# Altium footprint library HW_HOLLAND_NCDM_MONITOR_R1.PcbLib: 472 footprints (part 9 of 30)
Each footprint in its own frame and in the unit in brackets; x right, y up, seen from the top. Pads: shape width x height; smd on the part's side, far side on the other; paste and mask are expansions set on the pad; w line width, h text height; cw(c..) or ccw(c..) is an arc to the next point about the centre after c.
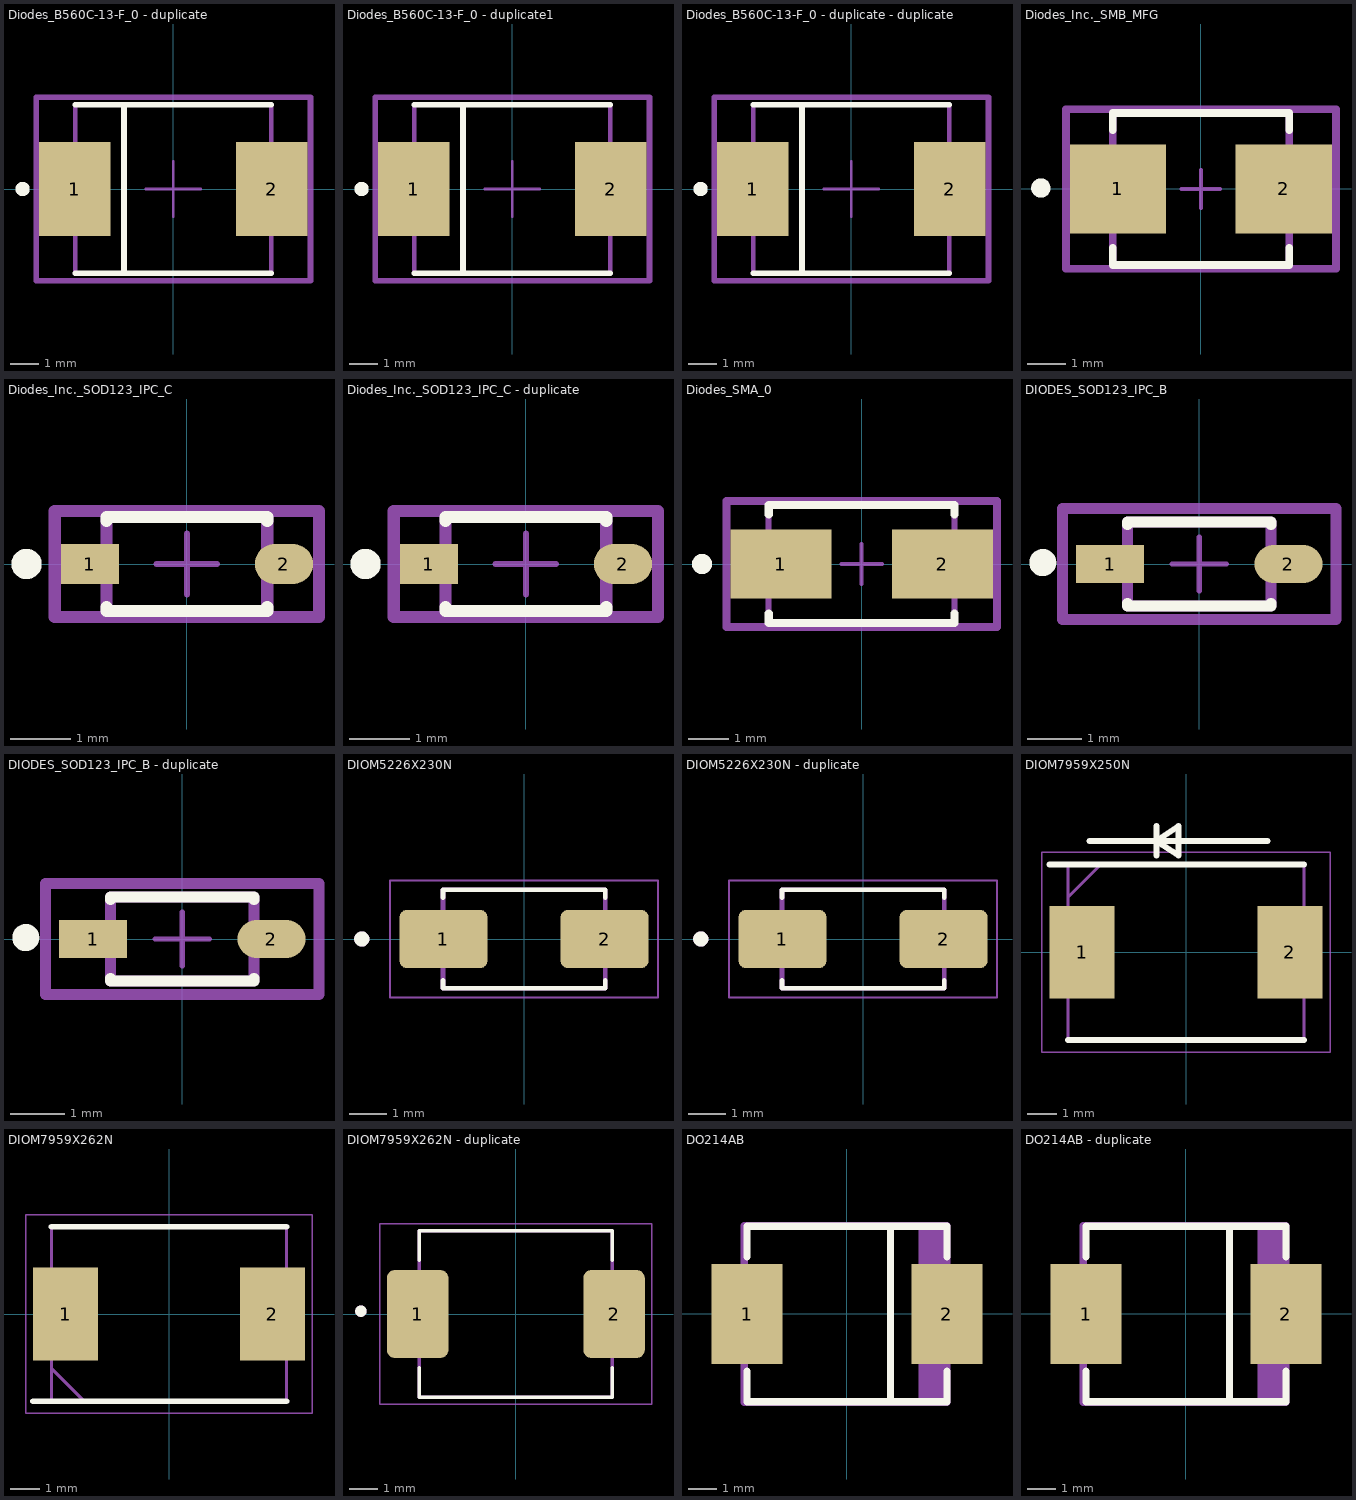
[diagram p8: the footprints below, top view; thin cyan lines are the x and y axes]

## Diodes_B560C-13-F_0 - duplicate [mm]
pads (2):
  rect 2.5x3.3 smd paste+0 mask+0: 1(-3.45,0) 2(3.45,0)
Top Overlay:
  circle w0.25: c-5.275,0 r0.125
  lines w0.2: -3.427,-2.953 3.427,-2.953 ; -3.427,2.953 3.427,2.953 ; -1.725,-2.852 -1.725,2.852
Top Courtyard:
  lines w0.2: -4.8,-3.21 4.8,-3.21 4.8,3.21 -4.8,3.21 -4.8,-3.21
  text ".Designator" at 0,0 h1
Mechanical 12:
  lines w0.15: -3.427,-2.953 3.427,-2.953 3.427,2.953 -3.427,2.953 -3.427,-2.953
Mechanical 15:
  lines w0.1: -0.963,0 0.963,0 ; 0,-0.963 0,0.963
  lines w0.2: -4.8,-3.21 4.8,-3.21 4.8,3.21 -4.8,3.21 -4.8,-3.21
3D body "Diode_Diodes_B560C-13-F_eec.STEP": height 0.25, standoff 0, extent -4.8,-3.21 4.8,3.21

## Diodes_B560C-13-F_0 - duplicate1 [mm]
pads (2):
  rect 2.5x3.3 smd paste+0 mask+0: 1(-3.45,0) 2(3.45,0)
Top Overlay:
  circle w0.25: c-5.275,0 r0.125
  lines w0.2: -3.427,-2.953 3.427,-2.953 ; -3.427,2.953 3.427,2.953 ; -1.725,-2.852 -1.725,2.852
Top Courtyard:
  lines w0.2: -4.8,-3.21 -4.8,3.21 4.8,3.21 4.8,-3.21 -4.8,-3.21
  text ".Designator" at 0,0 h1
Mechanical 12:
  lines w0.15: -3.427,-2.953 -3.427,2.953 3.427,2.953 3.427,-2.953 -3.427,-2.953
Mechanical 15:
  lines w0.1: -0.963,0 0.963,0 ; 0,-0.963 0,0.963
  lines w0.2: -4.8,-3.21 -4.8,3.21 4.8,3.21 4.8,-3.21 -4.8,-3.21
3D body "User Library-DO-214AB(SMC).STEP": height 2.67, standoff 0.03, extent -4.064,-3.15 4.064,3.15

## Diodes_B560C-13-F_0 - duplicate - duplicate [mm]
pads (2):
  rect 2.5x3.3 smd paste+0 mask+0: 1(-3.45,0) 2(3.45,0)
Top Overlay:
  circle w0.25: c-5.275,0 r0.125
  lines w0.2: -3.427,-2.953 3.427,-2.953 ; -3.427,2.953 3.427,2.953 ; -1.725,-2.852 -1.725,2.852
Top Courtyard:
  lines w0.2: -4.8,-3.21 4.8,-3.21 4.8,3.21 -4.8,3.21 -4.8,-3.21
  text ".Designator" at 0,0 h1
Mechanical 12:
  lines w0.15: -3.427,-2.953 3.427,-2.953 3.427,2.953 -3.427,2.953 -3.427,-2.953
Mechanical 15:
  lines w0.1: -0.963,0 0.963,0 ; 0,-0.963 0,0.963
  lines w0.2: -4.8,-3.21 4.8,-3.21 4.8,3.21 -4.8,3.21 -4.8,-3.21
3D body "Diode_Diodes_B560C-13-F_eec.STEP": height 0.25, standoff 0, extent -4.8,-3.21 4.8,3.21

## Diodes_Inc._SMB_MFG [mm]
pads (2):
  rect 2.5x2.3 smd paste+0 mask+0: 1(-2.15,0) 2(2.15,0)
Top Overlay:
  circle w0.25: c-4.15,0.025 r0.125
  lines w0.2: -2.285,-1.525 -2.285,-1.97 2.285,-1.97 2.285,-1.525 ; -2.285,1.525 -2.285,1.97 2.285,1.97 2.285,1.525
Top Courtyard:
  lines w0.2: -3.5,-2.07 3.5,-2.07 3.5,2.07 -3.5,2.07 -3.5,-2.07
  text ".Designator" at 0,0 h1.25
Mechanical 12:
  lines w0.2: -2.285,-1.97 2.285,-1.97 2.285,1.97 -2.285,1.97 -2.285,-1.97
Mechanical 15:
  lines w0.1: -0.5,0 0.5,0 ; 0,-0.5 0,0.5
  lines w0.2: -3.5,-2.07 3.5,-2.07 3.5,2.07 -3.5,2.07 -3.5,-2.07
3D body "Diode_Diodes_Inc._B240-13-F_eec.STEP": height 2.5, standoff 0, extent -2.648,-1.81 2.648,1.81

## Diodes_Inc._SOD123_IPC_C [mm]
pads (2):
  rect 0.957x0.662 smd paste+0 mask+0: 1(-1.6,0)
  rrect100% 0.957x0.662 smd paste+0 mask+0: 2(1.6,0)
Top Overlay:
  circle w0.25: c-2.645,0 r0.125
  lines w0.2: -1.325,-0.706 -1.325,-0.775 1.325,-0.775 1.325,-0.706 ; -1.325,0.706 -1.325,0.775 1.325,0.775 1.325,0.706
Top Courtyard:
  lines w0.2: -2.179,-0.875 -2.179,0.875 2.179,0.875 2.179,-0.875 -2.179,-0.875
  text ".Designator" at 0,0 h1
Mechanical 12:
  lines w0.2: -1.325,-0.775 -1.325,0.775 1.325,0.775 1.325,-0.775 -1.325,-0.775
Mechanical 15:
  lines w0.1: -0.5,0 0.5,0 ; 0,-0.5 0,0.5
  lines w0.2: -2.179,-0.875 -2.179,0.875 2.179,0.875 2.179,-0.875 -2.179,-0.875
3D body "Diode_Diodes_Inc._1N4148W-13-F_eec.STEP": height 0.25, standoff 0, extent -2.179,-0.875 2.179,0.875

## Diodes_Inc._SOD123_IPC_C - duplicate [mm]
pads (2):
  rect 0.957x0.662 smd paste+0 mask+0: 1(-1.6,0)
  rrect100% 0.957x0.662 smd paste+0 mask+0: 2(1.6,0)
Top Overlay:
  circle w0.25: c-2.645,0 r0.125
  lines w0.2: -1.325,-0.706 -1.325,-0.775 1.325,-0.775 1.325,-0.706 ; -1.325,0.706 -1.325,0.775 1.325,0.775 1.325,0.706
Top Courtyard:
  lines w0.2: -2.179,-0.875 -2.179,0.875 2.179,0.875 2.179,-0.875 -2.179,-0.875
  text ".Designator" at 0,0 h1
Mechanical 12:
  lines w0.2: -1.325,-0.775 -1.325,0.775 1.325,0.775 1.325,-0.775 -1.325,-0.775
Mechanical 15:
  lines w0.1: -0.5,0 0.5,0 ; 0,-0.5 0,0.5
  lines w0.2: -2.179,-0.875 -2.179,0.875 2.179,0.875 2.179,-0.875 -2.179,-0.875
3D body "Diode_Diodes_Inc._1N4148W-13-F_eec.STEP": height 0.25, standoff 0, extent -2.179,-0.875 2.179,0.875

## Diodes_SMA_0 [mm]
pads (2):
  rect 2.5x1.7 smd paste+0 mask+0: 1(-2,0) 2(2,0)
Top Overlay:
  circle w0.25: c-3.95,0 r0.125
  lines w0.2: -2.3,-1.225 -2.3,-1.46 2.3,-1.46 2.3,-1.225 ; -2.3,1.225 -2.3,1.46 2.3,1.46 2.3,1.225
Top Courtyard:
  lines w0.2: -3.35,-1.56 -3.35,1.56 3.35,1.56 3.35,-1.56 -3.35,-1.56
  text ".Designator" at 0,0 h1.25
Mechanical 12:
  lines w0.15: -2.3,-1.46 -2.3,1.46 2.3,1.46 2.3,-1.46 -2.3,-1.46
Mechanical 15:
  lines w0.1: -0.5,0 0.5,0 ; 0,-0.5 0,0.5
  lines w0.2: -3.35,-1.56 -3.35,1.56 3.35,1.56 3.35,-1.56 -3.35,-1.56
3D body "Diode_Diodes_B340LA-13-F_eec.STEP": height 2.5, standoff 0, extent -2.569,-1.296 2.561,1.309

## DIODES_SOD123_IPC_B [mm]
pads (2):
  rect 1.257x0.702 smd paste+0 mask+0: 1(-1.65,0)
  rrect100% 1.257x0.702 smd paste+0 mask+0: 2(1.65,0)
Top Overlay:
  circle w0.25: c-2.895,0.026 r0.125
  lines w0.2: -1.325,-0.726 -1.325,-0.775 1.325,-0.775 1.325,-0.726 ; -1.325,0.726 -1.325,0.775 1.325,0.775 1.325,0.726
Top Courtyard:
  lines w0.2: -2.529,-1.025 2.529,-1.025 2.529,1.025 -2.529,1.025 -2.529,-1.025
  text ".Designator" at 0,0.188 h1
Mechanical 12:
  lines w0.2: -1.325,-0.775 1.325,-0.775 1.325,0.775 -1.325,0.775 -1.325,-0.775
Mechanical 15:
  lines w0.1: -0.5,0 0.5,0 ; 0,-0.5 0,0.5
  lines w0.2: -2.529,-1.025 2.529,-1.025 2.529,1.025 -2.529,1.025 -2.529,-1.025
3D body "Diode_Diodes_1N5819HW-7-F_eec.STEP": height 1.45, standoff 0, extent -1.825,-0.775 1.825,0.775

## DIODES_SOD123_IPC_B - duplicate [mm]
pads (2):
  rect 1.257x0.702 smd paste+0 mask+0: 1(-1.65,0)
  rrect100% 1.257x0.702 smd paste+0 mask+0: 2(1.65,0)
Top Overlay:
  circle w0.25: c-2.895,0.026 r0.125
  lines w0.2: -1.325,-0.726 -1.325,-0.775 1.325,-0.775 1.325,-0.726 ; -1.325,0.726 -1.325,0.775 1.325,0.775 1.325,0.726
Top Courtyard:
  lines w0.2: -2.529,-1.025 2.529,-1.025 2.529,1.025 -2.529,1.025 -2.529,-1.025
  text ".Designator" at 0,0.188 h1
Mechanical 12:
  lines w0.2: -1.325,-0.775 1.325,-0.775 1.325,0.775 -1.325,0.775 -1.325,-0.775
Mechanical 15:
  lines w0.1: -0.5,0 0.5,0 ; 0,-0.5 0,0.5
  lines w0.2: -2.529,-1.025 2.529,-1.025 2.529,1.025 -2.529,1.025 -2.529,-1.025
3D body "Diode_Diodes_1N5819HW-7-F_eec.STEP": height 1.45, standoff 0, extent -1.825,-0.775 1.825,0.775

## DIOM5226X230N [mm]
pads (2):
  rrect25% 2.33x1.55 smd: 1(-2.135,0) 2(2.135,0)
Top Overlay:
  circle w0.2: c-4.3,0 r0.1
  lines w0.127: -2.15,-1.095 -2.15,-1.302 2.15,-1.302 2.15,-1.095 ; -2.15,1.095 -2.15,1.302 2.15,1.302 2.15,1.095
Mechanical 13:
  circle w0.2: c-4.3,0 r0.1
  lines w0.127: -2.15,-1.302 2.15,-1.302 2.15,1.302 -2.15,1.302 -2.15,-1.302
Mechanical 15:
  lines w0.05: -3.55,-1.552 -3.55,1.552 3.55,1.552 3.55,-1.552 -3.55,-1.552
3D body "SMA (DO-214AC).STEP": height 2.3, standoff 0, extent -2.6,-1.45 2.6,1.45

## DIOM5226X230N - duplicate [mm]
pads (2):
  rrect25% 2.33x1.55 smd: 1(-2.135,0) 2(2.135,0)
Top Overlay:
  circle w0.2: c-4.3,0 r0.1
  lines w0.127: -2.15,-1.095 -2.15,-1.302 2.15,-1.302 2.15,-1.095 ; -2.15,1.095 -2.15,1.302 2.15,1.302 2.15,1.095
Mechanical 13:
  circle w0.2: c-4.3,0 r0.1
  lines w0.127: -2.15,-1.302 -2.15,1.302 2.15,1.302 2.15,-1.302 -2.15,-1.302
Mechanical 15:
  lines w0.05: -3.55,-1.552 3.55,-1.552 3.55,1.552 -3.55,1.552 -3.55,-1.552
3D body "SMA (DO-214AC).STEP": height 2.3, standoff 0, extent -2.6,-1.45 2.6,1.45

## DIOM7959X250N [mm]
pads (2):
  rect 2.2x3.1 smd: 1(-3.5,0) 2(3.5,0)
Top Overlay:
  lines w0.2: -4.6,2.952 3.97,2.952 ; -3.97,-2.952 3.97,-2.952 ; 2.75,3.75 -3.25,3.75 -1,3.75 ; -1,3.75 -1,4.25 -1,3.5 -1,3.25 -1,3.75 ; -1,3.75 -0.25,3.25 -0.25,4.25 -1,3.75
Mechanical 13:
  lines w0.1: -3.97,1.852 -2.87,2.952 ; -3.97,-2.952 3.97,-2.952 3.97,2.952 -3.97,2.952 -3.97,-2.952
Mechanical 15:
  lines w0.05: -4.85,-3.36 4.85,-3.36 4.85,3.36 -4.85,3.36 -4.85,-3.36
3D body "B560C-13-F.stp": height 2.5, standoff 0, extent -3.97,-2.953 3.97,2.953

## DIOM7959X262N [mm]
pads (2):
  rect 2.2x3.15 smd: 1(-3.5,0) 2(3.5,0)
Top Overlay:
  lines w0.2: -4.6,-2.952 3.97,-2.952 ; -3.97,2.952 3.97,2.952
Mechanical 13:
  lines w0.1: -3.97,-1.852 -2.87,-2.952 ; -3.97,-2.952 3.97,-2.952 3.97,2.952 -3.97,2.952 -3.97,-2.952
Mechanical 15:
  lines w0.05: -4.85,-3.36 4.85,-3.36 4.85,3.36 -4.85,3.36 -4.85,-3.36
3D body "SMCJ26A.stp": height 2.62, standoff 0, extent -3.97,-2.952 3.97,2.953

## DIOM7959X262N - duplicate [mm]
pads (2):
  rrect25% 2.18x3.12 smd: 1(-3.485,0) 2(3.485,0)
Top Overlay:
  circle w0.2: c-5.5,0.1 r0.1
  lines w0.127: -3.427,-1.9 -3.427,-2.953 3.427,-2.953 3.427,-1.9 ; -3.427,1.9 -3.427,2.953 3.427,2.953 3.427,1.9
Mechanical 13:
  circle w0.2: c-5.5,0.1 r0.1
  lines w0.127: -3.427,-2.953 -3.427,2.953 3.427,2.953 3.427,-2.953 -3.427,-2.953
Mechanical 15:
  lines w0.05: -4.825,-3.203 -4.825,3.203 4.825,3.203 4.825,-3.203 -4.825,-3.203
3D body "SMCJ58CA.step": height 2.63, standoff 0.01, extent -3.97,-2.953 3.97,2.952

## DO214AB [mm]
pads (2):
  rect 2.5x3.5 smd: 1(-3.5,0) 2(3.5,0)
Top Overlay:
  lines w0.254: -3.5,-3.075 3.5,-3.075 ; -3.5,-3 -3.5,-2 ; -3.5,2 -3.5,3.075 3.5,3.075 3.5,2 ; 1.524,-3 1.524,3 ; 3.5,-3 3.5,-2
Top Designator:
  region: 3.5,3.1 2.5,3.1 2.5,-3.1 3.5,-3.1
  lines w0.254: -3.6,-3.1 -3.6,3.1 3.5,3.1 3.5,-3.1 -3.6,-3.1
  text ".Designator" at -7.618,-0.508 h1.52
3D body "DO-214AB.stp": height 2.65, standoff 0, extent -4.027,-3.125 4.123,3.125

## DO214AB - duplicate [mm]
pads (2):
  rect 2.5x3.5 smd: 1(-3.5,0) 2(3.5,0)
Top Overlay:
  lines w0.254: -3.5,-3.075 3.5,-3.075 ; -3.5,-3 -3.5,-2 ; -3.5,2 -3.5,3.075 3.5,3.075 3.5,2 ; 1.524,-3 1.524,3 ; 3.5,-3 3.5,-2
Top Designator:
  region: 3.5,3.1 2.5,3.1 2.5,-3.1 3.5,-3.1
  lines w0.254: -3.6,-3.1 3.5,-3.1 3.5,3.1 -3.6,3.1 -3.6,-3.1
  text ".Designator" at -7.618,-0.508 h1.52
3D body "DO-214AB.stp": height 2.65, standoff 0, extent -4.027,-3.125 4.123,3.125